# Altium footprint library Resistance.PcbLib: 47 footprints (part 2 of 3)
Each footprint in its own frame and in the unit in brackets; x right, y up, seen from the top. Pads: shape width x height; smd on the part's side, far side on the other; paste and mask are expansions set on the pad; w line width, h text height; cw(c..) or ccw(c..) is an arc to the next point about the centre after c.
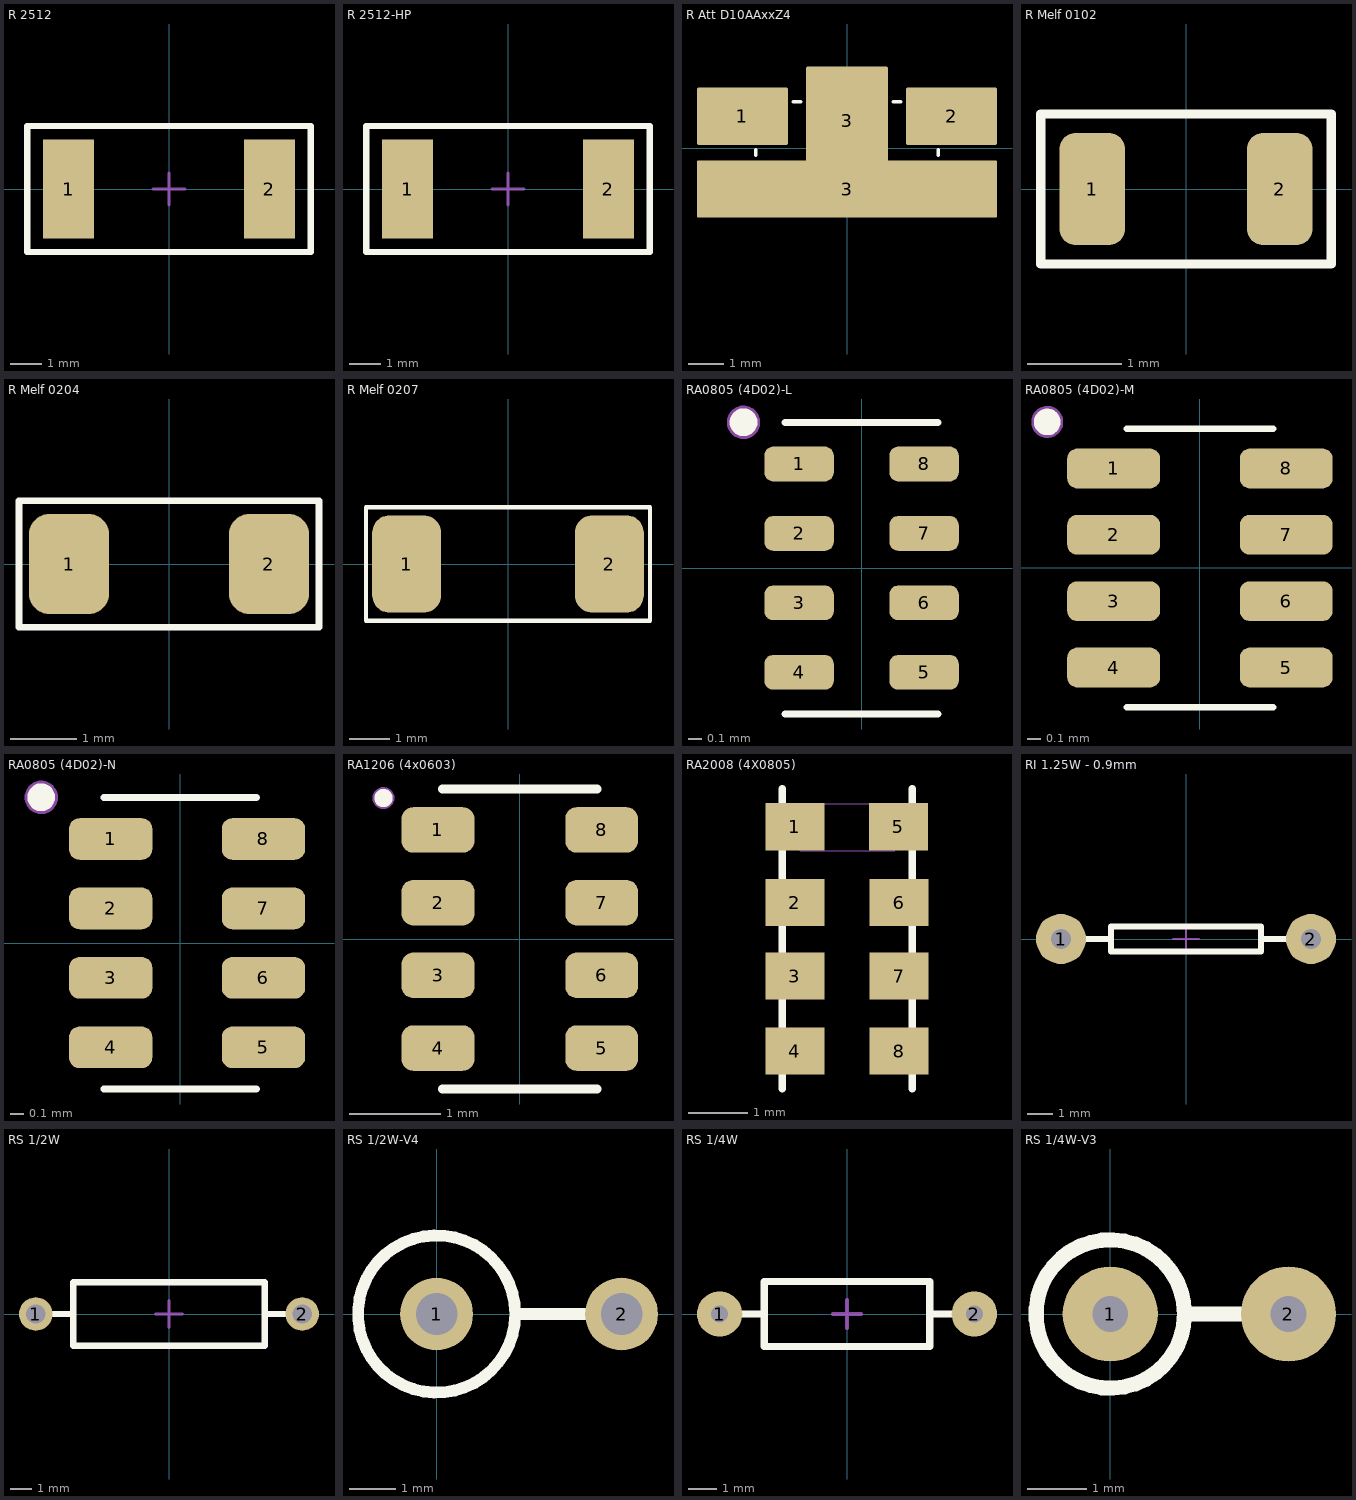
[diagram p1: the footprints below, top view; thin cyan lines are the x and y axes]

## R 2512 [mm] "1Wï¿½ï¿½Æ¬ï¿½ï¿½ï¿½ï¿½"
pads (2):
  rect 1.65x3.2 smd: 1(-3.24,0) 2(3.24,0)
Top Overlay:
  lines w0.203: -4.572,-2.032 4.572,-2.032 4.572,2.032 -4.572,2.032 -4.572,-2.032
Mechanical 15:
  lines w0.1: -0.508,0 0.508,0 ; 0,-0.508 0,0.508
3D body "R 2512.STEP": height 0.55, standoff -0.02, extent -3.2,-1.6 3.2,1.6

## R 2512-HP [mm] "1Wï¿½ß¾ï¿½ï¿½ï¿½ï¿½ï¿½Æ¬ï¿½ï¿½ï¿½ï¿½"
pads (2):
  rect 1.65x3.2 smd: 1(-3.24,0) 2(3.24,0)
Top Overlay:
  lines w0.203: -4.572,-2.032 4.572,-2.032 4.572,2.032 -4.572,2.032 -4.572,-2.032
Mechanical 15:
  lines w0.1: -0.508,0 0.508,0 ; 0,-0.508 0,0.508
3D body "R 2512-HP.STEP": height 0.55, standoff -0.02, extent -3.2,-1.6 3.2,1.6

## R Att D10AAxxZ4 [mil]
pads (4):
  rrect5% 100x63 smd: 1(-115,35) 2(115,35)
  rrect5% 330x63 smd: 3(0,-45)
  rrect5% 90x120 smd: 3(0,30)
Top Layer:
  lines w1: -96,10 -70,10 -70,45 -96,45
Top Overlay:
  lines w3.94: -100.39,-7.87 -100.39,-1.97 ; -59.06,51.18 -51.18,51.18 ; 51.18,51.18 59.06,51.18 ; 100.39,-7.87 100.39,-1.97
3D body: height 25.98, standoff 25, extent -96,-46 96,45
3D body: height 25, standoff 0, extent -100,-50 100,50

## R Melf 0102 [mm] "SMD MMU 0102 0.2W   0.1%   150V"
height 1.1
pads (2):
  rrect50% 0.7x1.2 smd: 1(-1,0) 2(1,0)
Top Overlay:
  lines w0.1: -1.55,-0.8 1.55,-0.8 1.55,0.8 -1.55,0.8 -1.55,-0.8
3D body "Melf-0102.STEP": height 1.25, standoff 0.15, extent -1,-0.55 1,0.55

## R Melf 0204 [mm] "SMD MMA 0204 0.25W 0.1%   200V"
height 0.55
pads (2):
  rrect50% 1.2x1.5 smd: 1(-1.5,0) 2(1.5,0)
Top Overlay:
  lines w0.1: -2.25,-0.95 -2.25,0.95 2.25,0.95 2.25,-0.95 -2.25,-0.95
3D body "Melf-0204.STEP": height 1.4, standoff 0, extent -1.7,-0.7 1.7,0.7

## R Melf 0207 [mm] "SMD MMB 0207 0.4W   0.1%   200V"
height 2.5
pads (2):
  rrect50% 1.7x2.4 smd: 1(-2.5,0) 2(2.5,0)
Top Overlay:
  lines w0.1: -3.5,-1.4 -3.5,1.4 3.5,1.4 3.5,-1.4 -3.5,-1.4
3D body "Melf-0207.STEP": height 2.2, standoff 0, extent -2.65,-1.1 2.65,1.1

## RA0805 (4D02)-L [mm] "Chip Array, Flat, 8-Leads, Pitch 0.50mm,  Body 2.00x1.00mm,  IPC High Density"
height 0.45
pads (8):
  rrect50% 0.5x0.25 smd: 1(-0.45,0.75) 2(-0.45,0.25) 3(-0.45,-0.25) 4(-0.45,-0.75) 5(0.45,-0.75) 6(0.45,-0.25) 7(0.45,0.25) 8(0.45,0.75)
Top Overlay:
  circle w0.1: c-0.85,1.05 r0.05
  lines w0.05: -0.55,-1.05 0.55,-1.05 ; -0.55,1.05 0.55,1.05
Top Assembly:
  circle w0.12: c-0.85,1.05 r0.06
3D body "RA 741C083 (2x1mm).STEP": height 0.35, standoff -0.03, extent -0.502,-1 0.502,1

## RA0805 (4D02)-M [mm] "Chip Array, Flat, 8-Leads, Pitch 0.50mm,  Body 2.00x1.00mm,  IPC Medium Density"
height 0.45
pads (8):
  rrect50% 0.7x0.3 smd: 1(-0.65,0.75) 2(-0.65,0.25) 3(-0.65,-0.25) 4(-0.65,-0.75) 5(0.65,-0.75) 6(0.65,-0.25) 7(0.65,0.25) 8(0.65,0.75)
Top Overlay:
  circle w0.1: c-1.15,1.1 r0.05
  lines w0.05: -0.55,-1.05 0.55,-1.05 ; -0.55,1.05 0.55,1.05
Top Assembly:
  circle w0.12: c-1.15,1.1 r0.06
3D body "RA 741C083 (2x1mm).STEP": height 0.35, standoff -0.03, extent -0.502,-1 0.502,1

## RA0805 (4D02)-N [mm] "Chip Array, Flat, 8-Leads, Pitch 0.50mm,  Body 2.00x1.00mm,  IPC Medium Density"
height 0.45
pads (8):
  rrect50% 0.6x0.3 smd: 1(-0.5,0.75) 2(-0.5,0.25) 3(-0.5,-0.25) 4(-0.5,-0.75) 5(0.6,-0.75) 6(0.6,-0.25) 7(0.6,0.25) 8(0.6,0.75)
Top Overlay:
  circle w0.1: c-1,1.05 r0.05
  lines w0.05: -0.55,-1.05 0.55,-1.05 ; -0.55,1.05 0.55,1.05
Top Assembly:
  circle w0.12: c-1,1.05 r0.06
3D body "RA 741C083 (2x1mm).STEP": height 0.35, standoff -0.03, extent -0.502,-1 0.502,1

## RA1206 (4x0603) [mm]
pads (8):
  rrect50% 0.8x0.5 smd: 1(-0.9,1.2) 2(-0.9,0.4) 3(-0.9,-0.4) 4(-0.9,-1.2) 5(0.9,-1.2) 6(0.9,-0.4) 7(0.9,0.4) 8(0.9,1.2)
Top Overlay:
  circle w0.1: c-1.5,1.55 r0.05
  lines w0.1: -0.85,-1.65 0.85,-1.65 ; -0.85,1.65 0.85,1.65
Top Assembly:
  circle w0.12: c-1.5,1.55 r0.06
3D body "SMD R1206-4Way-Var2-1.STEP": height 0.5, standoff 0, extent -0.8,-1.6 0.8,1.6

## RA2008 (4X0805) [mm]
pads (8):
  rect 1x0.8 smd: 1(-16.396,-47.232) 2(-16.396,-48.514) 3(-16.396,-49.759) 4(-16.396,-51.029) 5(-14.643,-47.232) 6(-14.63,-48.514) 7(-14.63,-49.759) 8(-14.63,-51.029)
Top Overlay:
  lines w0.127: -16.607,-51.672 -16.607,-46.592 ; -14.407,-51.672 -14.407,-46.592
Mechanical 13:
  lines w0.01: -16.307,-47.638 -14.707,-47.638 -14.707,-46.838 -16.307,-46.838 -16.307,-47.638
3D body "User Library-Resistors-1.STEP": height 0.05, standoff -0.33, extent -16.607,-51.672 -14.407,-46.592

## RI 1.25W - 0.9mm [mm] "ï¿½ï¿½ï¿½ï¿½ï¿½ï¿½ï¿½ï¿½ï¿½è£¬ï¿½Å¾ï¿½10mmï"
pads (2):
  round 2 hole 0.8: 1(-5,0) 2(5,0)
Top Overlay:
  lines w0.254: -4,0 -3,0 ; 3,0 4,0 ; -3,-0.5 3,-0.5 3,0.5 -3,0.5 -3,-0.5
Mechanical 15:
  lines w0.1: -0.508,0 0.508,0 ; 0,-0.508 0,0.508
3D body "50mR-0.9mm.STEP": height 15.4, standoff -3.84, extent -6,-0.45 6,0.45

## RS 1/2W [mm] "Ö±ï¿½ï¿½É«ï¿½ï¿½ï¿½ï¿½ï¿½è£¬ï¿½Å¾ï¿½12.5mmï¿½ï"
pads (2):
  round 1.575 hole 0.9: 1(-6.25,0) 2(6.25,0)
Top Overlay:
  lines w0.305: -5.5,0 -4.5,0 ; 4.5,0 5.5,0 ; -4.5,-1.5 4.5,-1.5 4.5,1.5 -4.5,1.5 -4.5,-1.5
Mechanical 15:
  lines w0.127: -0.635,0 0.635,0 ; 0,-0.635 0,0.635
3D body "RS 1-2W.STEP": height 3.11, standoff -3.4, extent -6.5,-1.51 6.5,1.51

## RS 1/2W-V4 [mil] "Ö±ï¿½ï¿½É«ï¿½ï¿½ï¿½ï¿½ï¿½è£¬ï¿½Å¾ï¿½4mmï¿½ï"
pads (2):
  round 62 hole 35.43: 1(0,0) 2(157.48,0)
Top Overlay:
  circle w10: c0,0 r66.93
  lines w10: 66.93,0 133.86,0
3D body "RS 1-2W-V4.STEP": height 423.17, standoff -137.89, extent -59.44,-59.44 167.33,59.46

## RS 1/4W [mm] "Ö±ï¿½ï¿½É«ï¿½ï¿½ï¿½ï¿½ï¿½è£¬ï¿½Å¾ï¿½9mmï¿½ï"
pads (2):
  round 1.6 hole 0.6: 1(-4.5,0) 2(4.5,0)
Top Overlay:
  lines w0.254: -3.683,0 -3.048,0 ; 3.048,0 3.683,0 ; -2.921,-1.143 -2.921,1.143 2.921,1.143 2.921,-1.143 -2.921,-1.143
Mechanical 15:
  lines w0.127: -0.508,0 0.508,0 ; 0,-0.508 0,0.508
3D body "RS 1-4W.STEP": height 2.32, standoff -3.49, extent -4.725,-1.16 4.725,1.16

## RS 1/4W-V3 [mm] "Ö±ï¿½ï¿½É«ï¿½ï¿½ï¿½ï¿½ï¿½è£¬ï¿½Å¾ï¿½3mmï¿½ï"
pads (2):
  round 1.6 hole 0.6: 1(0,0) 2(3,0)
Top Overlay:
  circle w0.254: c0,0 r1.25
  lines w0.254: 1.25,0 2.5,0
3D body "RS 1-4W-V3.STEP": height 7.42, standoff -3.5, extent -1.16,-1.16 3.225,1.16